# Altium footprint library MyPcbLib.PcbLib: 657 footprints (part 14 of 42)
Each footprint in its own frame and in the unit in brackets; x right, y up, seen from the top. Pads: shape width x height; smd on the part's side, far side on the other; paste and mask are expansions set on the pad; w line width, h text height; cw(c..) or ccw(c..) is an arc to the next point about the centre after c.
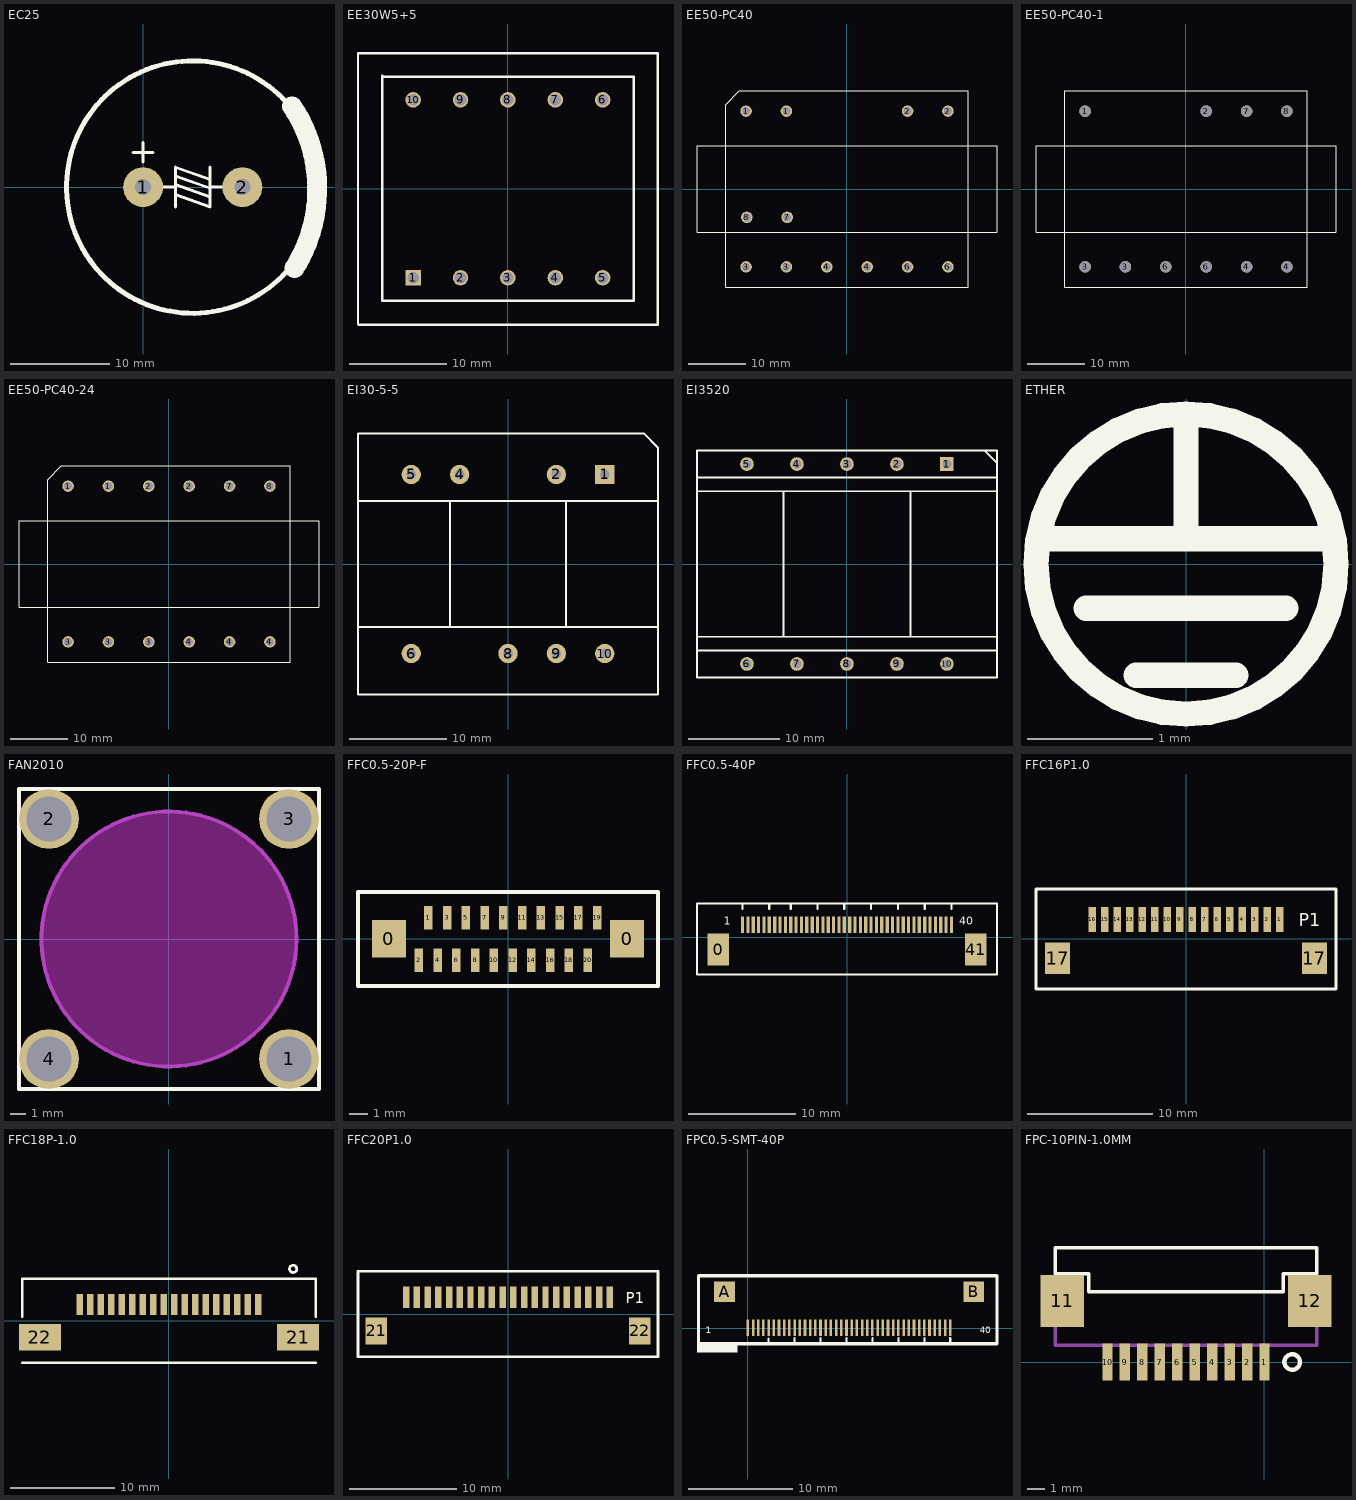
[diagram p13: the footprints below, top view; thin cyan lines are the x and y axes]

## EC25 [mm]
pads (2):
  round 4 hole 1.6: 1(0,0) 2(10,0)
Top Overlay:
  circle w0.5: c5,0 r12.7
  lines w0.3: -1,3.5 1,3.5 ; 0,2.5 0,4.5 ; 2,0 3.25,0 ; 3.25,-2 3.25,2 6.75,0.75 ; 3.25,-0.75 6.75,-2 6.75,2 ; 3.25,0.25 6.75,-1 ; 3.25,1.125 6.75,-0.125 ; 6.75,0 8,0
  lines w2: 15,8.125 cw(c2.519,-0.196) 15.239,-8.145

## EE30W5+5 [mm]
pads (10):
  rect 1.6x1.6 hole 1.2: 1(-9.8,-9.2)
  round 1.6 hole 1.2: 2(-4.9,-9.2) 3(0,-9.2) 4(4.9,-9.2) 5(9.8,-9.2) 6(9.8,9.2) 7(4.9,9.2) 8(0,9.2) 9(-4.9,9.2) 10(-9.8,9.2)
Top Overlay:
  lines w0.254: -15.5,-14 -15.5,14 ; -15.443,-14.046 15.519,-14.046 ; -15.443,13.995 15.392,13.995 ; -13.005,-11.557 -13.005,11.684 ; -13,-11.6 13,-11.6 ; -13,11.6 13,11.6 ; 13.005,-11.557 13.005,11.557 ; 15.5,-14 15.5,14

## EE50-PC40 [mm]
pads (12):
  round 2 / inner round 2 / far side round 3 hole 1.4: 1(-17.5,13.5) 1(-10.5,13.5) 2(10.5,13.5) 2(17.5,13.5) 3(-17.5,-13.5) 3(-10.5,-13.5) 4(-3.5,-13.5) 4(3.5,-13.5) 6(10.5,-13.5) 6(17.5,-13.5)
  round 2 hole 1.4: 7(-10.364,-4.915) 8(-17.364,-4.915)
Top Overlay:
  lines w0.203: -26,-7.5 -26,7.5 26,7.5 26,-7.5 -26,-7.5 ; -21,-17 21,-17 21,17 -18.636,17 -21,14.636 -21,-17

## EE50-PC40-1 [mm]
pads (10):
  round 2 / inner round 2 / far side round 3.5 hole 2: 1(-17.5,13.5) 2(3.5,13.5) 3(-17.5,-13.5) 3(-10.5,-13.5) 4(10.5,-13.5) 4(17.5,-13.5) 6(-3.5,-13.5) 6(3.5,-13.5) 7(10.5,13.5) 8(17.5,13.5)
Top Overlay:
  lines w0.203: -26,-7.5 26,-7.5 26,7.5 -26,7.5 -26,-7.5 ; -21,-17 -21,16.998 -20.998,17 21,17 21,-17 -21,-17

## EE50-PC40-24 [mm]
pads (12):
  round 2 / inner round 2 / far side round 3 hole 1.4: 1(-17.5,13.5) 1(-10.5,13.5) 2(-3.5,13.5) 2(3.5,13.5) 3(-17.5,-13.5) 3(-10.5,-13.5) 3(-3.5,-13.5) 4(3.5,-13.5) 4(10.5,-13.5) 4(17.5,-13.5) 7(10.5,13.5) 8(17.5,13.5)
Top Overlay:
  lines w0.203: -26,-7.5 -26,7.5 26,7.5 26,-7.5 -26,-7.5 ; -21,-17 21,-17 21,17 -18.636,17 -21,14.636 -21,-17

## EI30-5-5 [mm]
pads (8):
  rect 2x2 hole 1: 1(10,9.25)
  round 2 hole 1: 2(5,9.25) 4(-5,9.25) 5(-10,9.25) 6(-10,-9.25) 8(0,-9.25) 9(5,-9.25) 10(10,-9.25)
Top Overlay:
  lines w0.203: -15.5,-6.5 15.5,-6.5 ; -15.5,6.5 15.5,6.5 ; -6,-6.5 -6,6.5 ; 6,-6.5 6,6.5 ; -15.5,-13.5 15.5,-13.5 15.5,12.034 14.034,13.5 -15.5,13.5 -15.5,-13.5

## EI3520 [mm]
pads (10):
  rect 1.5x1.5 hole 1: 1(11,11)
  round 1.5 hole 1: 2(5.5,11) 3(0,11) 4(-5.5,11) 5(-11,11) 6(-11,-11) 7(-5.5,-11) 8(0,-11) 9(5.5,-11) 10(11,-11)
Top Overlay:
  lines w0.203: -16.5,-12.5 16.5,-12.5 ; -16.5,-9.5 16.5,-9.5 ; -16.5,-8 16.5,-8 ; -16.5,8 16.5,8 ; -16.5,9.5 16.5,9.5 ; -16.5,12.5 16.5,12.5 ; -16.485,-12.497 -16.485,12.497 ; -7,-8 -7,8 ; 7,-8 7,8 ; 15.113,12.471 15.138,12.471 16.459,11.151 ; 16.51,-12.497 16.51,12.497

## ETHER [mm]
Top Overlay:
  circle w0.203: c0,0 r1.2
  lines w0.203: -1.15,0.203 1.15,0.203 ; -0.8,-0.356 0.8,-0.356 ; -0.4,-0.889 0.4,-0.889 ; 0,0.2 0,1.2

## FAN2010 [mm]
pads (4):
  round 4 hole 3: 1(8,-8) 2(-8,8) 3(8,8) 4(-8,-8)
Top Overlay:
  lines w0.254: -10,-10 -10,10 10,10 10,-10 -10,-10
Keep-Out Layer:
  board cut-out: 0,-8.51 -0.834,-8.469 -1.66,-8.347 -2.47,-8.144 -3.257,-7.862 -4.012,-7.505 -4.728,-7.076 -5.399,-6.579 -6.018,-6.018 -6.579,-5.399 -7.076,-4.728 -7.505,-4.012 -7.862,-3.257 -8.144,-2.47 -8.347,-1.66 -8.469,-0.834 -8.51,0 -8.469,0.834 -8.347,1.66 -8.144,2.47 -7.862,3.257 -7.505,4.012 -7.076,4.728 -6.579,5.399 -6.018,6.018 -5.399,6.579 -4.728,7.076 -4.012,7.505 -3.257,7.862 -2.47,8.144 -1.66,8.347 -0.834,8.469 0,8.51 0.834,8.469 1.66,8.347 2.47,8.144 3.257,7.862 4.012,7.505 4.728,7.076 5.399,6.579 6.018,6.018 6.579,5.399 7.076,4.728 7.505,4.012 7.862,3.257 8.144,2.47 8.347,1.66 8.469,0.834 8.51,0 8.469,-0.834 8.347,-1.66 8.144,-2.47 7.862,-3.257 7.505,-4.012 7.076,-4.728 6.579,-5.399 6.018,-6.018 5.399,-6.579 4.728,-7.076 4.012,-7.505 3.257,-7.862 2.47,-8.144 1.66,-8.347 0.834,-8.469
Keep-Out Layer:
  circle w0.254: c0,0 r8.5
Mechanical 1:
  circle w0.254: c0,0 r8.5

## FFC0.5-20P-F [mm] "正脚位"
pads (22):
  rect 1.8x2 smd: 0(-6.35,0) 0(6.35,0)
  rect 0.45x1.25 smd: 1(-4.25,1.125) 2(-4.75,-1.125) 3(-3.25,1.125) 4(-3.75,-1.125) 5(-2.25,1.125) 6(-2.75,-1.125) 7(-1.25,1.125) 8(-1.75,-1.125) 9(-0.25,1.125) 10(-0.75,-1.125) 11(0.75,1.125) 12(0.25,-1.125) 13(1.75,1.125) 14(1.25,-1.125) 15(2.75,1.125) 16(2.25,-1.125) 17(3.75,1.125) 18(3.25,-1.125) 19(4.75,1.125) 20(4.25,-1.125)
Top Overlay:
  lines w0.203: -8,-2.5 -8,2.5 8,2.5 8,-2.5 -8,-2.5

## FFC0.5-40P [mm]
pads (42):
  rect 2x3 smd: 0(-12,-1.156) 41(12,-1.156)
  rect 0.3x1.5 smd: 1(-9.75,1.156) 2(-9.25,1.156) 3(-8.75,1.156) 4(-8.25,1.156) 5(-7.75,1.156) 6(-7.25,1.156) 7(-6.75,1.156) 8(-6.25,1.156) 9(-5.75,1.156) 10(-5.25,1.156) 11(-4.75,1.156) 12(-4.25,1.156) 13(-3.75,1.156) 14(-3.25,1.156) 15(-2.75,1.156) 16(-2.25,1.156) 17(-1.75,1.156) 18(-1.25,1.156) 19(-0.75,1.156) 20(-0.25,1.156) 21(0.25,1.156) 22(0.75,1.156) 23(1.25,1.156) 24(1.75,1.156) 25(2.25,1.156) 26(2.75,1.156) 27(3.25,1.156) 28(3.75,1.156) 29(4.25,1.156) 30(4.75,1.156) 31(5.25,1.156) 32(5.75,1.156) 33(6.25,1.156) 34(6.75,1.156) 35(7.25,1.156) 36(7.75,1.156) 37(8.25,1.156) 38(8.75,1.156) 39(9.25,1.156) 40(9.75,1.156)
Top Overlay:
  lines w0.203: -9.75,2.656 -9.75,3.156 ; -7.25,2.656 -7.25,3.156 ; -5.25,2.656 -5.25,3.156 ; -2.75,2.656 -2.75,3.156 ; -0.25,2.656 -0.25,3.156 ; 2.25,2.656 2.25,3.156 ; 4.75,2.656 4.75,3.156 ; 7.25,2.656 7.25,3.156 ; 9.75,2.656 9.75,3.156 ; -14,-3.5 14,-3.5 14,3.156 -14,3.156 -14,-3.5
  text "1" at -11.5,1.156 h0.76
  text "40" at 10.5,1.156 h0.76

## FFC16P1.0 [mm]
pads (18):
  rect 0.6x2 smd: 1(7.5,1.562) 2(6.5,1.562) 3(5.5,1.562) 4(4.5,1.562) 5(3.5,1.562) 6(2.5,1.562) 7(1.5,1.562) 8(0.5,1.562) 9(-0.5,1.562) 10(-1.5,1.562) 11(-2.5,1.562) 12(-3.5,1.562) 13(-4.5,1.562) 14(-5.5,1.562) 15(-6.5,1.562) 16(-7.5,1.562)
  rect 2x2.5 smd paste+0 mask+0.102: 17(-10.268,-1.562) 17(10.268,-1.562)
Top Overlay:
  lines w0.254: -12,-4.013 -12,3.987 12,3.987 12,-4.013 -12,-4.013
  text "P1" at 9,0.987 h1.02

## FFC18P-1.0 [mm]
pads (20):
  rect 0.6x2 smd: 1(8.5,1.575) 2(7.5,1.575) 3(6.5,1.575) 4(5.5,1.575) 5(4.5,1.575) 6(3.5,1.575) 7(2.5,1.575) 8(1.5,1.575) 9(0.5,1.575) 10(-0.5,1.575) 11(-1.5,1.575) 12(-2.5,1.575) 13(-3.5,1.575) 14(-4.5,1.575) 15(-5.5,1.575) 16(-6.5,1.575) 17(-7.5,1.575) 18(-8.5,1.575)
  rect 4x2.5 smd: 21(12.3,-1.575)
  rect 4x2.5 smd paste+0 mask+0.102: 22(-12.3,-1.575)
Top Overlay:
  circle w0.254: c11.836,4.955 r0.345
  lines w0.254: -14,-4 14,-4 ; -14,0.376 -14,4 14,4 14,0.376

## FFC20P1.0 [mm]
pads (22):
  rect 0.6x2 smd: 1(9.5,1.575) 2(8.5,1.575) 3(7.5,1.575) 4(6.5,1.575) 5(5.5,1.575) 6(4.5,1.575) 7(3.5,1.575) 8(2.5,1.575) 9(1.5,1.575) 10(0.5,1.575) 11(-0.5,1.575) 12(-1.5,1.575) 13(-2.5,1.575) 14(-3.5,1.575) 15(-4.5,1.575) 16(-5.5,1.575) 17(-6.5,1.575) 18(-7.5,1.575) 19(-8.5,1.575) 20(-9.5,1.575)
  rect 2x2.5 smd: 21(-12.3,-1.575)
  rect 2x2.5 smd paste+0 mask+0.102: 22(12.3,-1.575)
Top Overlay:
  lines w0.254: -14,-4 -14,4 14,4 14,-4 -14,-4
  text "P1" at 11,1 h1.02
3D body: height 2.54, standoff 0, extent -13.525,-4.242 13.475,2.558

## FPC0.5-SMT-40P [mm]
pads (42):
  rect 0.25x1.6 smd: 1(-0.003,0.022) 2(0.497,0.022) 3(0.997,0.022) 4(1.497,0.022) 5(1.997,0.022) 6(2.497,0.022) 7(2.997,0.022) 8(3.497,0.022) 9(3.997,0.022) 10(4.497,0.022) 11(4.997,0.022) 12(5.497,0.022) 13(5.997,0.022) 14(6.497,0.022) 15(6.997,0.022) 16(7.497,0.022) 17(7.997,0.022) 18(8.497,0.022) 19(8.997,0.022) 20(9.497,0.022) 21(9.997,0.022) 22(10.497,0.022) 23(10.997,0.022) 24(11.497,0.022) 25(11.997,0.022) 26(12.497,0.022) 27(12.997,0.022) 28(13.497,0.022) 29(13.997,0.022) 30(14.497,0.022) 31(14.997,0.022) 32(15.497,0.022) 33(15.997,0.022) 34(16.497,0.022) 35(16.997,0.022) 36(17.497,0.022) 37(17.997,0.022) 38(18.497,0.022) 39(18.997,0.022) 40(19.497,0.022)
  rect 2x2 smd: A(-2.251,3.511) B(21.749,3.511)
Top Overlay:
  rectangle: -4.903,-2.328 -1.019,-1.478
  lines w0.2: 1.997,-1.503 1.997,-1.003 ; 4.497,-1.503 4.497,-0.978 ; 6.997,-1.478 6.997,-0.978 ; 9.497,-1.453 9.497,-0.953 ; 11.997,-1.453 11.997,-0.953 ; 14.497,-1.453 14.497,-0.953 ; 16.997,-1.453 16.997,-0.953 ; 19.497,-1.478 19.497,-0.978
  lines w0.3: -4.753,-1.503 -4.753,5.047 23.997,5.047 23.997,-1.503 -4.753,-1.503
  text "1" at -4.067,-0.486 h0.64
  text "40" at 22.349,-0.486 h0.64

## FPC-10PIN-1.0MM [mm]
pads (12):
  rect 0.6x2.1 smd: 1(0,0) 2(-1,0) 3(-2,0) 4(-3,0) 5(-4,0) 6(-5,0) 7(-6,0) 8(-7,0) 9(-8,0) 10(-9,0)
  rect 2.5x3 smd: 11(-11.6,3.501) 12(2.6,3.501)
Top Overlay:
  circle w0.254: c1.587,0.001 r0.447
  lines w0.203: -12,5.057 -10.088,5.057 -10.088,4.041 1.088,4.041 1.088,5.057 3,5.057 3,6.558 -12,6.558 -12,5.057
Mechanical 1:
  lines w0.203: -12,4.65 -12,0.95 3,0.95 3,4.65